# Altium footprint library Altium_Lib.PcbLib: 334 footprints (part 10 of 21)
Each footprint in its own frame and in the unit in brackets; x right, y up, seen from the top. Pads: shape width x height; smd on the part's side, far side on the other; paste and mask are expansions set on the pad; w line width, h text height; cw(c..) or ccw(c..) is an arc to the next point about the centre after c.
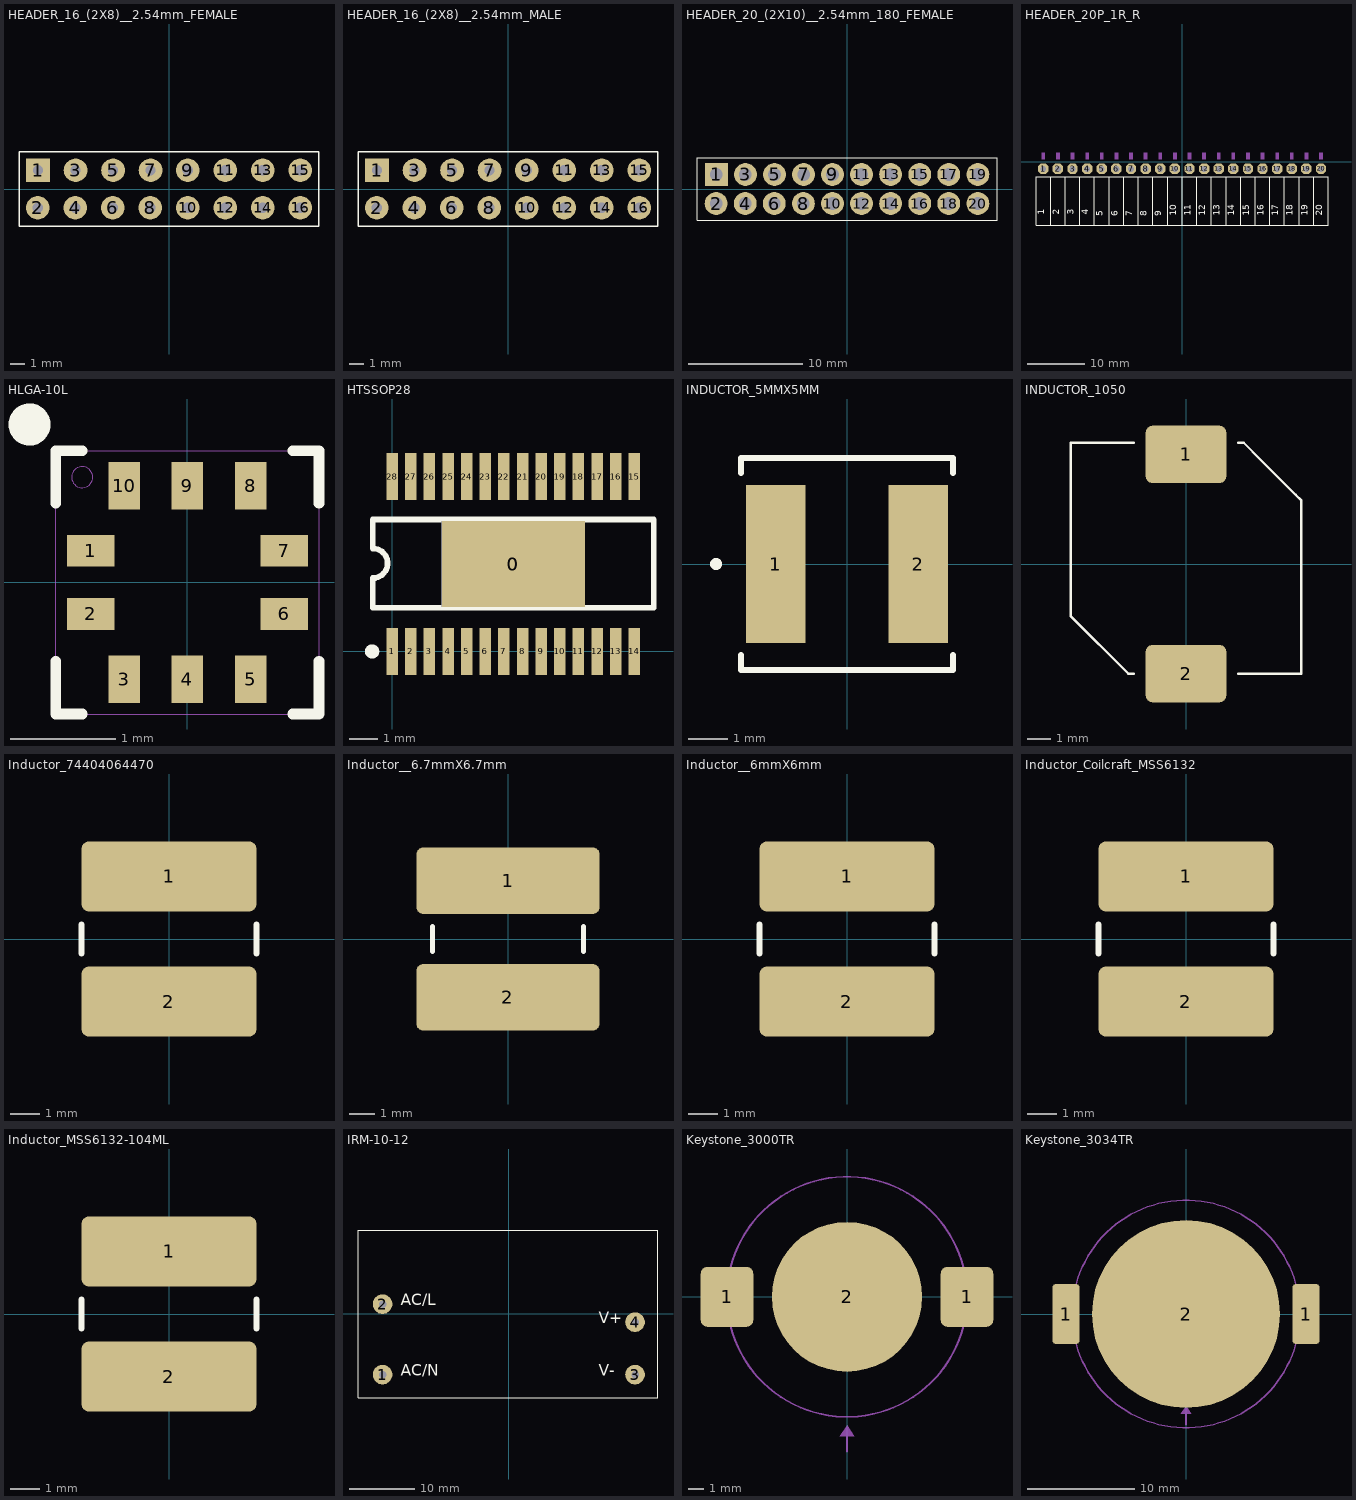
[diagram p9: the footprints below, top view; thin cyan lines are the x and y axes]

## HEADER_16_(2X8)__2.54mm_FEMALE [mm]
pads (16):
  rect 1.6x1.6 hole 0.7: 1(-8.87,1.27)
  round 1.6 hole 0.7: 2(-8.89,-1.27) 3(-6.33,1.27) 4(-6.35,-1.27) 5(-3.79,1.27) 6(-3.81,-1.27) 7(-1.25,1.27) 8(-1.27,-1.27) 9(1.27,1.27) 10(1.27,-1.27) 11(3.81,1.27) 12(3.81,-1.27) 13(6.35,1.27) 14(6.35,-1.27) 15(8.89,1.27) 16(8.89,-1.27)
Top Overlay:
  lines w0.1: -10.16,-2.54 -10.16,2.54 10.16,2.54 10.16,-2.54 -10.16,-2.54
3D body "803-xx-008-10-002000.STEP": height 4.1, standoff -3.28, extent -0.025,-2.54 10.235,2.54
3D body "803-xx-008-10-002000.STEP": height 4.1, standoff -3.28, extent -10.216,-2.54 0.044,2.54

## HEADER_16_(2X8)__2.54mm_MALE [mm]
pads (16):
  rect 1.6x1.6 hole 0.7: 1(-8.87,1.27)
  round 1.6 hole 0.7: 2(-8.89,-1.27) 3(-6.33,1.27) 4(-6.35,-1.27) 5(-3.79,1.27) 6(-3.81,-1.27) 7(-1.25,1.27) 8(-1.27,-1.27) 9(1.27,1.27) 10(1.27,-1.27) 11(3.81,1.27) 12(3.81,-1.27) 13(6.35,1.27) 14(6.35,-1.27) 15(8.89,1.27) 16(8.89,-1.27)
Top Overlay:
  lines w0.1: -10.16,-2.54 -10.16,2.54 10.16,2.54 10.16,-2.54 -10.16,-2.54
3D body "TD-104-T-A.stp": height 8.28, standoff -3.84, extent 0.076,-2.54 10.084,2.54
3D body "TD-104-T-A.stp": height 8.38, standoff -3.74, extent -10.084,-2.565 -0.076,2.515

## HEADER_20_(2X10)__2.54mm_180_FEMALE [mm]
pads (20):
  rect 2x2 hole 1.1: 1(-11.41,1.27)
  round 2 hole 1.1: 2(-11.43,-1.27) 3(-8.87,1.27) 4(-8.89,-1.27) 5(-6.33,1.27) 6(-6.35,-1.27) 7(-3.79,1.27) 8(-3.81,-1.27) 9(-1.27,1.27) 10(-1.27,-1.27) 11(1.27,1.27) 12(1.27,-1.27) 13(3.81,1.27) 14(3.81,-1.27) 15(6.35,1.27) 16(6.35,-1.27) 17(8.89,1.27) 18(8.89,-1.27) 19(11.43,1.27) 20(11.43,-1.27)
Top Overlay:
  lines w0.1: -13.1,-2.75 -13.1,2.75 13.1,2.75 13.1,-2.75 -13.1,-2.75
3D body "BG195-20-X-0350-X-X_revG.STEP": height 8.55, standoff -3.45, extent -13.1,-2.75 13.1,2.75

## HEADER_20P_1R_R [mm]
pads (20):
  oct 1.8x1.8 hole 1.016: 1(-24.13,-1.27) 2(-21.59,-1.27) 3(-19.05,-1.27) 4(-16.51,-1.27) 5(-13.97,-1.27) 6(-11.43,-1.27) 7(-8.89,-1.27) 8(-6.35,-1.27) 9(-3.81,-1.27) 10(-1.27,-1.27) 11(1.27,-1.27) 12(3.81,-1.27) 13(6.35,-1.27) 14(8.89,-1.27) 15(11.43,-1.27) 16(13.97,-1.27) 17(16.51,-1.27) 18(19.05,-1.27) 19(21.59,-1.27) 20(24.13,-1.27)
Top Overlay:
  lines w0.2: -22.86,-2.6 -22.86,-11.1 ; -20.32,-11.1 -20.32,-2.6 ; -17.78,-11.1 -17.78,-2.6 ; -15.24,-11.1 -15.24,-2.6 ; -12.7,-11.1 -12.7,-2.6 ; -10.16,-11.1 -10.16,-2.6 ; -7.62,-11.1 -7.62,-2.6 ; -5.08,-11.1 -5.08,-2.6 ; -2.54,-11.1 -2.54,-2.6 ; 0,-11.1 0,-2.6 ; 2.54,-11.1 2.54,-2.6 ; 5.08,-11.1 5.08,-2.6 ; 7.62,-11.1 7.62,-2.6 ; 10.16,-11.1 10.16,-2.6 ; 12.7,-11.1 12.7,-2.6 ; 15.24,-11.1 15.24,-2.6 ; 17.78,-11.1 17.78,-2.6 ; 20.32,-11.1 20.32,-2.6 ; 22.86,-11.1 22.86,-2.6 25.4,-2.6 25.4,-10.16 25.4,-11.1 -22.86,-11.1 ; 23.5,-2.6 -25.4,-2.6 -25.4,-11.1 -22.86,-11.1
  text "1" at -23.495,-9.271 h1.97
  text "2" at -20.955,-9.271 h1.97
  text "3" at -18.415,-9.271 h1.97
  text "4" at -15.875,-9.271 h1.97
  text "5" at -13.335,-9.525 h1.97
  text "6" at -10.795,-9.525 h1.97
  text "7" at -8.255,-9.525 h1.97
  text "8" at -5.715,-9.525 h1.97
  text "9" at -3.175,-9.525 h1.97
  text "10" at -0.635,-9.398 h1.97
  text "11" at 1.905,-9.398 h1.97
  text "12" at 4.445,-9.398 h1.97
  text "13" at 6.985,-9.398 h1.97
  text "14" at 9.525,-9.398 h1.97
  text "15" at 12.065,-9.398 h1.97
  text "16" at 14.605,-9.398 h1.97
  text "17" at 17.145,-9.398 h1.97
  text "18" at 19.685,-9.398 h1.97
  text "19" at 22.225,-9.398 h1.97
  text "20" at 24.765,-9.398 h1.97
Mechanical 16:
  rectangle: -24.46,0.406 -23.8,1.575
  rectangle: -21.92,0.406 -21.26,1.575
  rectangle: -19.38,0.406 -18.72,1.575
  rectangle: -24.46,-2.134 -23.8,-0.406
  rectangle: -21.92,-2.134 -21.26,-0.406
  rectangle: -19.38,-2.134 -18.72,-0.406
  rectangle: -16.84,0.406 -16.18,1.575
  rectangle: -14.3,0.406 -13.64,1.575
  rectangle: -16.84,-2.134 -16.18,-0.406
  rectangle: -14.3,-2.134 -13.64,-0.406
  rectangle: -11.76,-2.134 -11.1,-0.406
  rectangle: -9.22,-2.134 -8.56,-0.406
  rectangle: -11.76,0.406 -11.1,1.575
  rectangle: -9.22,0.406 -8.56,1.575
  rectangle: -6.68,0.406 -6.02,1.575
  rectangle: -4.14,0.406 -3.48,1.575
  rectangle: -1.6,0.406 -0.94,1.575
  rectangle: -6.68,-2.134 -6.02,-0.406
  rectangle: -4.14,-2.134 -3.48,-0.406
  rectangle: -1.6,-2.134 -0.94,-0.406
  rectangle: 0.94,0.406 1.6,1.575
  rectangle: 3.48,0.406 4.14,1.575
  rectangle: 0.94,-2.134 1.6,-0.406
  rectangle: 3.48,-2.134 4.14,-0.406
  rectangle: 6.02,0.406 6.68,1.575
  rectangle: 6.02,-2.134 6.68,-0.406
  rectangle: 8.56,0.406 9.22,1.575
  rectangle: 8.56,-2.134 9.22,-0.406
  rectangle: 11.1,0.406 11.76,1.575
  rectangle: 13.64,0.406 14.3,1.575
  rectangle: 11.1,-2.134 11.76,-0.406
  rectangle: 13.64,-2.134 14.3,-0.406
  rectangle: 16.18,0.406 16.84,1.575
  rectangle: 16.18,-2.134 16.84,-0.406
  rectangle: 18.72,0.406 19.38,1.575
  rectangle: 18.72,-2.134 19.38,-0.406
  rectangle: 21.26,0.406 21.92,1.575
  rectangle: 21.26,-2.134 21.92,-0.406
  rectangle: 23.8,0.406 24.46,1.575
  rectangle: 23.8,-2.134 24.46,-0.406
3D body "female_header_a-bl254-ea-g02d.stp": height 2.55, standoff -3.15, extent -15.365,-11.1 -10.035,-1.04
3D body "female_header_a-bl254-ea-g02d.stp": height 2.55, standoff -3.15, extent -10.265,-11.1 -4.935,-1.04
3D body "female_header_a-bl254-ea-g02d.stp": height 2.55, standoff -3.15, extent -20.465,-11.1 -15.135,-1.04
3D body "female_header_a-bl254-ea-g02d.stp": height 2.55, standoff -3.15, extent -25.565,-11.1 -20.235,-1.04
3D body "female_header_a-bl254-ea-g02d.stp": height 2.55, standoff -3.15, extent 20.235,-11.1 25.565,-1.04
3D body "female_header_a-bl254-ea-g02d.stp": height 2.55, standoff -3.15, extent 15.135,-11.1 20.465,-1.04
3D body "female_header_a-bl254-ea-g02d.stp": height 2.55, standoff -3.15, extent 10.035,-11.1 15.365,-1.04
3D body "female_header_a-bl254-ea-g02d.stp": height 2.55, standoff -3.15, extent 4.935,-11.1 10.265,-1.04
3D body "female_header_a-bl254-ea-g02d.stp": height 2.55, standoff -3.15, extent -0.165,-11.1 5.165,-1.04
3D body "female_header_a-bl254-ea-g02d.stp": height 2.55, standoff -3.15, extent -5.265,-11.1 0.065,-1.04

## HLGA-10L [mm]
pads (10):
  rect 0.45x0.3 smd mask+0.05: 1(-0.92,0.3) 2(-0.92,-0.3) 6(0.92,-0.3) 7(0.92,0.3)
  rect 0.3x0.45 smd mask+0.05: 3(-0.6,-0.92) 4(0,-0.92) 5(0.6,-0.92) 8(0.6,0.92) 9(0,0.92) 10(-0.6,0.92)
Top Overlay:
  circle w0.2: c-1.5,1.5 r0.1
  lines w0.1: -1.25,-0.75 -1.25,-1.25 -1,-1.25 ; -1.25,0.75 -1.25,1.25 -1,1.25 ; 1,-1.25 1.25,-1.25 1.25,-0.75 ; 1,1.25 1.25,1.25 1.25,0.75
Mechanical 27:
  lines w0.01: -1.25,-1.25 -1.25,1.25 1.25,1.25 1.25,-1.25 -1.25,-1.25
Mechanical 28:
  circle w0.01: c-1,1 r0.1
3D body: height 0.8, standoff 0, extent -1.249,-1.249 1.249,1.249
3D body: height 0.8, standoff 0.01, extent -1.249,-1.249 1.249,1.249
3D body: height 0.8, standoff 0.2, extent -1.099,0.901 -0.901,1.099

## HTSSOP28 [mm]
pads (30):
  rect 5x3 smd: 0(4.225,3.05)
  rect 5x3 smd far side: 0(4.225,3.05)
  rect 0.4x1.65 smd: 1(0,0) 2(0.65,0) 3(1.3,0) 4(1.95,0) 5(2.6,0) 6(3.25,0) 7(3.9,0) 8(4.55,0) 9(5.2,0) 10(5.85,0) 11(6.5,0) 12(7.15,0) 13(7.8,0) 14(8.45,0) 15(8.45,6.1) 16(7.8,6.1) 17(7.15,6.1) 18(6.5,6.1) 19(5.85,6.1) 20(5.2,6.1) 21(4.55,6.1) 22(3.9,6.1) 23(3.25,6.1) 24(2.6,6.1) 25(1.95,6.1) 26(1.3,6.1) 27(0.65,6.1) 28(0,6.1)
Top Overlay:
  circle w0.25: c-0.7,0 r0.125
  lines w0.2: -0.675,2.558 ccw(c-0.675,3.075) -0.675,3.592 ; -0.675,2.558 -0.675,1.525 9.125,1.525 9.125,4.6 -0.675,4.6 -0.675,3.592
3D body "PWP28_5P18X3P1_TEX-M.step": height 1.7, standoff 0, extent -0.65,-0.302 9.15,6.302

## INDUCTOR_5MMX5MM [mil]
pads (2):
  rect 59x157 smd: 1(-71,0) 2(71,0)
Top Overlay:
  circle w6: c-130.5,0 r3
  lines w6: -105.5,-90.61 -105.5,-105.5 105.5,-105.5 105.5,-90.61 ; -105.5,90.61 -105.5,105.5 105.5,105.5 105.5,90.61
3D body "IND_TAIYO_NRS5014_TAY.step": height 55, standoff 0, extent -100.59,-100.52 100.6,100.51

## INDUCTOR_1050 [mm] "10mmx10mm"
height 5
pads (2):
  rrect25% 3.5x2.5 smd: 1(0,4.75) 2(0,-4.75)
Top Overlay:
  lines w0.1: -2.25,-4.75 -2.5,-4.75 -5,-2.25 -5,-0.75 -5,5.25 -2.25,5.25 ; 2.25,-4.75 5,-4.75 5,2.75 4.75,3 3.25,4.5 2.5,5.25 2.25,5.25
3D body "STEP-WE-PD-1050-rev1.stp": height 4.9, standoff 0.1, extent -5,-4.75 5,5.25

## Inductor_74404064470 [mm] "6x6mm"
height 5
pads (2):
  rrect20% 6x2.4 smd: 1(0,2.15) 2(0,-2.15)
Top Overlay:
  lines w0.2: -3,-0.5 -3,0.5 ; 3,-0.5 3,0.5
3D body "STEP-WE-LQS-6045-rev1.stp": height 4.55, standoff 0.05, extent -3,-3 3,3

## Inductor__6.7mmX6.7mm [mm] "6.7x6.7mm"
height 3.8
pads (2):
  rrect20% 7.3x2.65 smd: 1(0,2.325) 2(0,-2.325)
Top Overlay:
  lines w0.2: -3,-0.5 -3,0.5 ; 3,-0.5 3,0.5
3D body "STEP-WE-LQS-6045-rev1.stp": height 4.55, standoff 0.05, extent -3,-3 3,3

## Inductor__6mmX6mm [mm] "6x6mm"
height 5
pads (2):
  rrect20% 6x2.4 smd: 1(0,2.15) 2(0,-2.15)
Top Overlay:
  lines w0.2: -3,-0.5 -3,0.5 ; 3,-0.5 3,0.5
3D body "STEP-WE-LQS-6045-rev1.stp": height 4.55, standoff 0.05, extent -3,-3 3,3

## Inductor_Coilcraft_MSS6132 [mm] "6X6MM"
height 5
pads (2):
  rrect20% 6x2.4 smd: 1(0,2.15) 2(0,-2.15)
Top Overlay:
  lines w0.2: -3,-0.5 -3,0.5 ; 3,-0.5 3,0.5
3D body "Coilcraft-MSS6132.STEP": height 3.2, standoff 0, extent -2.997,-2.968 2.997,2.997

## Inductor_MSS6132-104ML [mm] "6x6mm"
height 5
pads (2):
  rrect20% 6x2.4 smd: 1(0,2.15) 2(0,-2.15)
Top Overlay:
  lines w0.2: -3,-0.5 -3,0.5 ; 3,-0.5 3,0.5
3D body "Coilcraft-MSS6132.STEP": height 3.2, standoff 0, extent -2.997,-2.968 2.997,2.997

## IRM-10-12 [mm]
pads (4):
  round 3 hole 1.15: 1(-19.25,-9.25) 2(-19.25,1.5) 3(19.25,-9.25) 4(19.25,-1.25)
Top Overlay:
  lines w0.1: -23,-12.75 -23,12.75 22.75,12.75 22.75,-12.75 -23,-12.75
  text "AC/L" at -16.5,0.75 h3
  text "AC/N" at -16.5,-10 h3
  text "V-" at 13.75,-10 h3
  text "V+" at 13.75,-2 h3
3D body "User Library-IRM-10-12.STEP": height 22.05, standoff -3.5, extent -22.85,-12.75 22.85,12.65

## Keystone_3000TR [mm]
pads (3):
  rrect25% 3.5x4 smd: 1(-8,0) 1(8,0)
  round 10 smd paste-17.5 mask+0.127: 2(0,0)
Mechanical 13:
  circle w0.127: c0,0 r8.004
  region: -0.5,-9.301 0.5,-9.301 0,-8.55
  lines w0.15: 0,-10.3 0,-9.301
3D body "User Library-BK-885-TR.STEP": height 3.17, standoff 0, extent -9.78,-6.35 9.78,6.35

## Keystone_3034TR [mil]
pads (3):
  rrect25% 100x220 smd: 1(-440,0) 1(440,0)
  round 688.98 smd paste-688.98 mask+5: 2(0,0)
Mechanical 13:
  circle w5: c0,0 r417.32
  region: -19.68,-366.18 19.68,-366.18 0,-336.61
  lines w5.91: 0,-405.51 0,-366.18
3D body "Keystone_PN3034TR.STEP": height 160, standoff 0, extent -457.5,-344.01 457.5,304.77